# Altium footprint library Molex FFC - FPC Connectors (SMT).PcbLib: 638 footprints (part 13 of 40)
Each footprint in its own frame and in the unit in brackets; x right, y up, seen from the top. Pads: shape width x height; smd on the part's side, far side on the other; paste and mask are expansions set on the pad; w line width, h text height; cw(c..) or ccw(c..) is an arc to the next point about the centre after c.
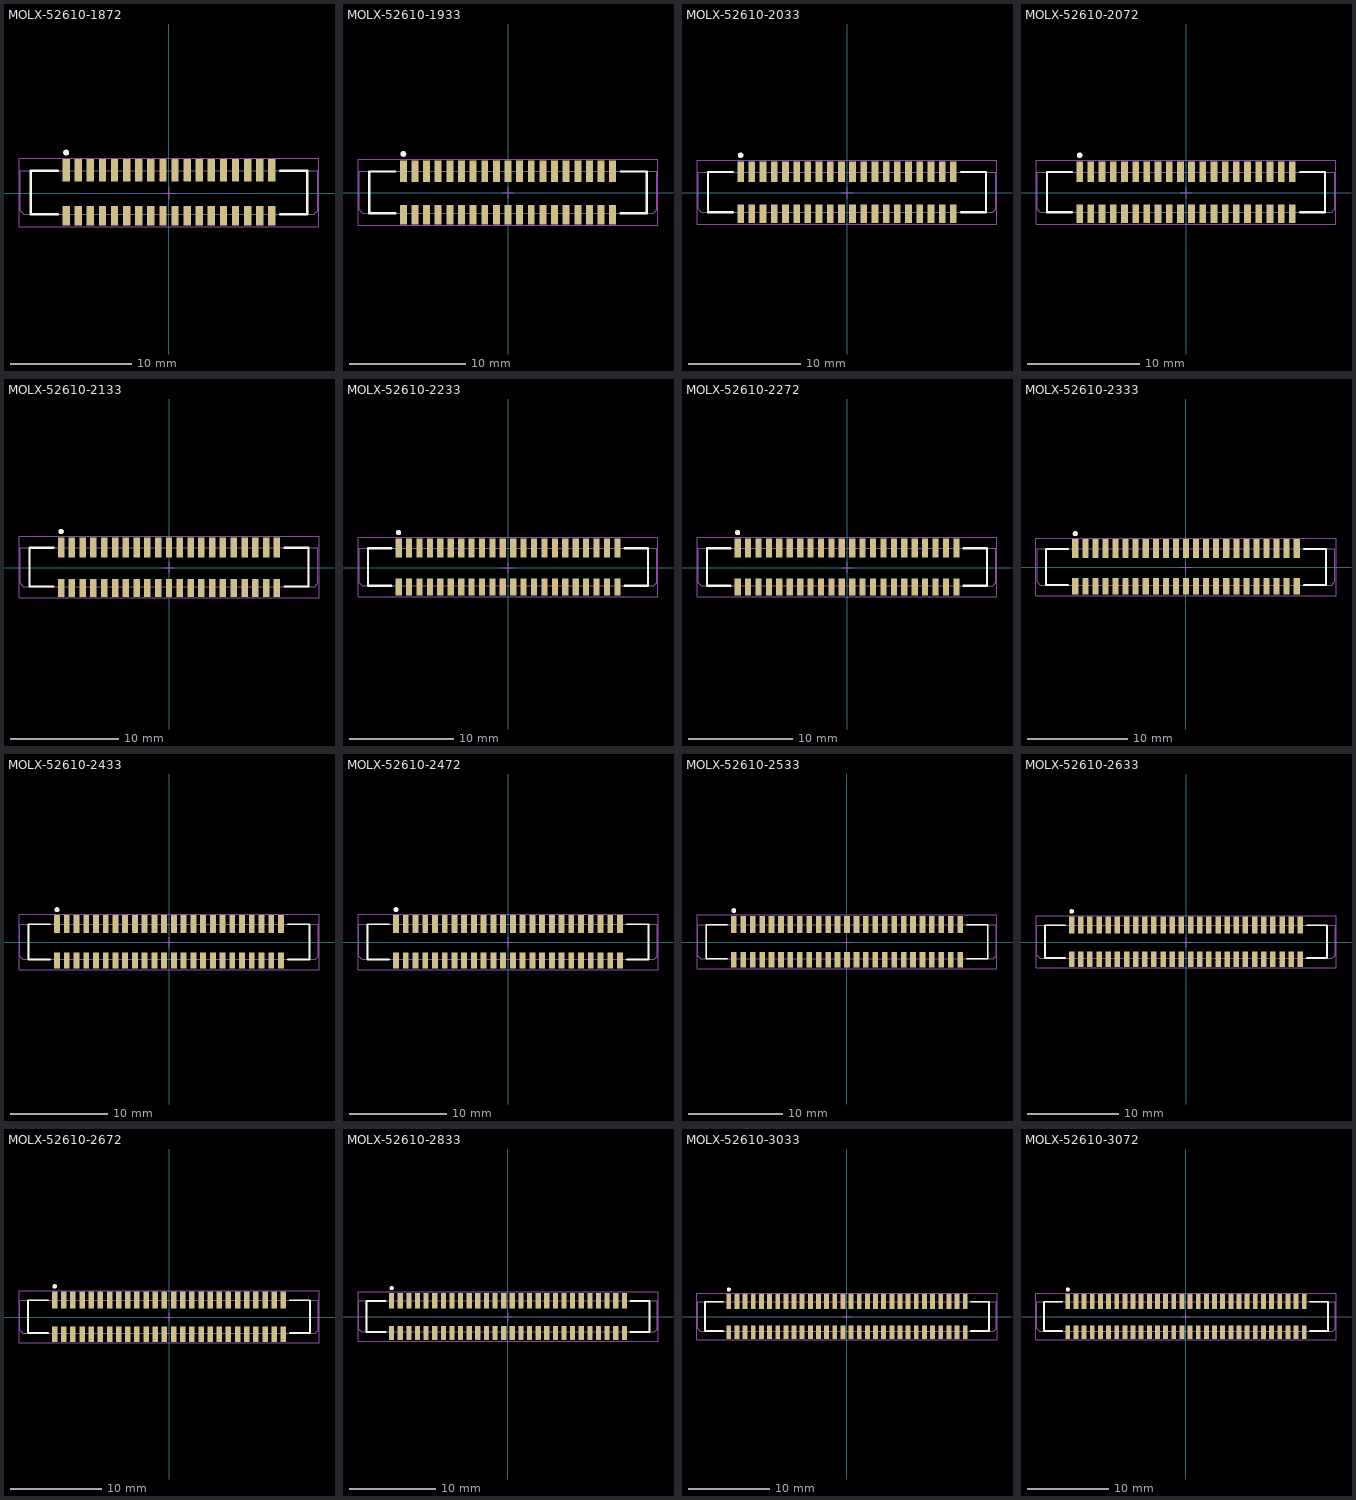
[diagram p12: the footprints below, top view; thin cyan lines are the x and y axes]

## MOLX-52610-1872 [mm] "FPC Connector, 18-Leads, Vertical, Pitch 1.0 mm, Mated Height 5.75 mm, SMT"
height 5.762
pads (36):
  rect 0.6x1.85 smd: 1A(-8.5,1.875) 2A(-7.5,1.875) 3A(-6.5,1.875) 4A(-5.5,1.875) 5A(-4.5,1.875) 6A(-3.5,1.875) 7A(-2.5,1.875) 8A(-1.5,1.875) 9A(-0.5,1.875) 10A(0.5,1.875) 11A(1.5,1.875) 12A(2.5,1.875) 13A(3.5,1.875) 14A(4.5,1.875) 15A(5.5,1.875) 16A(6.5,1.875) 17A(7.5,1.875) 18A(8.5,1.875)
  rect 0.6x1.65 smd: 1B(-8.5,-1.875) 2B(-7.5,-1.875) 3B(-6.5,-1.875) 4B(-5.5,-1.875) 5B(-4.5,-1.875) 6B(-3.5,-1.875) 7B(-2.5,-1.875) 8B(-1.5,-1.875) 9B(-0.5,-1.875) 10B(0.5,-1.875) 11B(1.5,-1.875) 12B(2.5,-1.875) 13B(3.5,-1.875) 14B(4.5,-1.875) 15B(5.5,-1.875) 16B(6.5,-1.875) 17B(7.5,-1.875) 18B(8.5,-1.875)
Top Overlay:
  circle w0.25: c-8.5,3.35 r0.125
  lines w0.2: -9.2,-1.75 -11.425,-1.75 -11.425,1.85 -9.2,1.85 ; 9.2,-1.75 11.425,-1.75 11.425,1.85 9.2,1.85
Mechanical 13:
  lines w0.1: -11.425,-1.75 -11.425,1.85 ; 11.425,-1.75 11.425,1.85 ; -12.3,-1.45 -12,-1.75 12,-1.75 12.3,-1.45 12.3,1.85 -12.3,1.85 -12.3,-1.45
Mechanical 15:
  lines w0.05: -12.4,-2.8 12.4,-2.8 12.4,2.9 -12.4,2.9 -12.4,-2.8
  lines w0.1: -0.5,0 0.5,0 ; 0,-0.5 0,0.5
3D body: height 0.25, standoff 0, extent -12.3,-2.24 12.3,2.26

## MOLX-52610-1933 [mm] "FPC Connector, 19-Leads, Vertical, Pitch 1.0 mm, Mated Height 5.75 mm, SMT"
height 5.762
pads (38):
  rect 0.6x1.85 smd: 1A(-9,1.875) 2A(-8,1.875) 3A(-7,1.875) 4A(-6,1.875) 5A(-5,1.875) 6A(-4,1.875) 7A(-3,1.875) 8A(-2,1.875) 9A(-1,1.875) 10A(0,1.875) 11A(1,1.875) 12A(2,1.875) 13A(3,1.875) 14A(4,1.875) 15A(5,1.875) 16A(6,1.875) 17A(7,1.875) 18A(8,1.875) 19A(9,1.875)
  rect 0.6x1.65 smd: 1B(-9,-1.875) 2B(-8,-1.875) 3B(-7,-1.875) 4B(-6,-1.875) 5B(-5,-1.875) 6B(-4,-1.875) 7B(-3,-1.875) 8B(-2,-1.875) 9B(-1,-1.875) 10B(0,-1.875) 11B(1,-1.875) 12B(2,-1.875) 13B(3,-1.875) 14B(4,-1.875) 15B(5,-1.875) 16B(6,-1.875) 17B(7,-1.875) 18B(8,-1.875) 19B(9,-1.875)
Top Overlay:
  circle w0.25: c-9,3.35 r0.125
  lines w0.2: -9.7,-1.75 -11.925,-1.75 -11.925,1.85 -9.7,1.85 ; 9.7,-1.75 11.925,-1.75 11.925,1.85 9.7,1.85
Mechanical 13:
  lines w0.1: -11.925,-1.75 -11.925,1.85 ; 11.925,-1.75 11.925,1.85 ; -12.8,-1.45 -12.8,1.85 12.8,1.85 12.8,-1.45 12.5,-1.75 -12.5,-1.75 -12.8,-1.45
Mechanical 15:
  lines w0.05: -12.9,-2.8 -12.9,2.9 12.9,2.9 12.9,-2.8 -12.9,-2.8
  lines w0.1: -0.5,0 0.5,0 ; 0,-0.5 0,0.5
3D body: height 0.25, standoff 0, extent -12.8,-2.24 12.8,2.26

## MOLX-52610-2033 [mm] "FPC Connector, 20-Leads, Vertical, Pitch 1.0 mm, Mated Height 5.75 mm, SMT"
height 5.762
pads (40):
  rect 0.6x1.85 smd: 1A(-9.5,1.875) 2A(-8.5,1.875) 3A(-7.5,1.875) 4A(-6.5,1.875) 5A(-5.5,1.875) 6A(-4.5,1.875) 7A(-3.5,1.875) 8A(-2.5,1.875) 9A(-1.5,1.875) 10A(-0.5,1.875) 11A(0.5,1.875) 12A(1.5,1.875) 13A(2.5,1.875) 14A(3.5,1.875) 15A(4.5,1.875) 16A(5.5,1.875) 17A(6.5,1.875) 18A(7.5,1.875) 19A(8.5,1.875) 20A(9.5,1.875)
  rect 0.6x1.65 smd: 1B(-9.5,-1.875) 2B(-8.5,-1.875) 3B(-7.5,-1.875) 4B(-6.5,-1.875) 5B(-5.5,-1.875) 6B(-4.5,-1.875) 7B(-3.5,-1.875) 8B(-2.5,-1.875) 9B(-1.5,-1.875) 10B(-0.5,-1.875) 11B(0.5,-1.875) 12B(1.5,-1.875) 13B(2.5,-1.875) 14B(3.5,-1.875) 15B(4.5,-1.875) 16B(5.5,-1.875) 17B(6.5,-1.875) 18B(7.5,-1.875) 19B(8.5,-1.875) 20B(9.5,-1.875)
Top Overlay:
  circle w0.25: c-9.5,3.35 r0.125
  lines w0.2: -10.2,-1.75 -12.425,-1.75 -12.425,1.85 -10.2,1.85 ; 10.2,1.85 12.425,1.85 12.425,-1.75 10.2,-1.75
Mechanical 13:
  lines w0.1: -12.425,-1.75 -12.425,1.85 ; 12.425,-1.75 12.425,1.85 ; -13.3,-1.45 -13,-1.75 13,-1.75 13.3,-1.45 13.3,1.85 -13.3,1.85 -13.3,-1.45
Mechanical 15:
  lines w0.05: -13.4,-2.8 13.4,-2.8 13.4,2.9 -13.4,2.9 -13.4,-2.8
  lines w0.1: -0.5,0 0.5,0 ; 0,-0.5 0,0.5
3D body: height 0.25, standoff 0, extent -13.3,-2.24 13.3,2.26

## MOLX-52610-2072 [mm] "FPC Connector, 20-Leads, Vertical, Pitch 1.0 mm, Mated Height 5.75 mm, SMT"
height 5.762
pads (40):
  rect 0.6x1.85 smd: 1A(-9.5,1.875) 2A(-8.5,1.875) 3A(-7.5,1.875) 4A(-6.5,1.875) 5A(-5.5,1.875) 6A(-4.5,1.875) 7A(-3.5,1.875) 8A(-2.5,1.875) 9A(-1.5,1.875) 10A(-0.5,1.875) 11A(0.5,1.875) 12A(1.5,1.875) 13A(2.5,1.875) 14A(3.5,1.875) 15A(4.5,1.875) 16A(5.5,1.875) 17A(6.5,1.875) 18A(7.5,1.875) 19A(8.5,1.875) 20A(9.5,1.875)
  rect 0.6x1.65 smd: 1B(-9.5,-1.875) 2B(-8.5,-1.875) 3B(-7.5,-1.875) 4B(-6.5,-1.875) 5B(-5.5,-1.875) 6B(-4.5,-1.875) 7B(-3.5,-1.875) 8B(-2.5,-1.875) 9B(-1.5,-1.875) 10B(-0.5,-1.875) 11B(0.5,-1.875) 12B(1.5,-1.875) 13B(2.5,-1.875) 14B(3.5,-1.875) 15B(4.5,-1.875) 16B(5.5,-1.875) 17B(6.5,-1.875) 18B(7.5,-1.875) 19B(8.5,-1.875) 20B(9.5,-1.875)
Top Overlay:
  circle w0.25: c-9.5,3.35 r0.125
  lines w0.2: -10.2,-1.75 -12.425,-1.75 -12.425,1.85 -10.2,1.85 ; 10.2,1.85 12.425,1.85 12.425,-1.75 10.2,-1.75
Mechanical 13:
  lines w0.1: -12.425,-1.75 -12.425,1.85 ; 12.425,-1.75 12.425,1.85 ; -13.3,-1.45 -13,-1.75 13,-1.75 13.3,-1.45 13.3,1.85 -13.3,1.85 -13.3,-1.45
Mechanical 15:
  lines w0.05: -13.4,-2.8 13.4,-2.8 13.4,2.9 -13.4,2.9 -13.4,-2.8
  lines w0.1: -0.5,0 0.5,0 ; 0,-0.5 0,0.5
3D body: height 0.25, standoff 0, extent -13.3,-2.24 13.3,2.26

## MOLX-52610-2133 [mm] "FPC Connector, 21-Leads, Vertical, Pitch 1.0 mm, Mated Height 5.75 mm, SMT"
height 5.762
pads (42):
  rect 0.6x1.85 smd: 1A(-10,1.875) 2A(-9,1.875) 3A(-8,1.875) 4A(-7,1.875) 5A(-6,1.875) 6A(-5,1.875) 7A(-4,1.875) 8A(-3,1.875) 9A(-2,1.875) 10A(-1,1.875) 11A(0,1.875) 12A(1,1.875) 13A(2,1.875) 14A(3,1.875) 15A(4,1.875) 16A(5,1.875) 17A(6,1.875) 18A(7,1.875) 19A(8,1.875) 20A(9,1.875) 21A(10,1.875)
  rect 0.6x1.65 smd: 1B(-10,-1.875) 2B(-9,-1.875) 3B(-8,-1.875) 4B(-7,-1.875) 5B(-6,-1.875) 6B(-5,-1.875) 7B(-4,-1.875) 8B(-3,-1.875) 9B(-2,-1.875) 10B(-1,-1.875) 11B(0,-1.875) 12B(1,-1.875) 13B(2,-1.875) 14B(3,-1.875) 15B(4,-1.875) 16B(5,-1.875) 17B(6,-1.875) 18B(7,-1.875) 19B(8,-1.875) 20B(9,-1.875) 21B(10,-1.875)
Top Overlay:
  circle w0.25: c-10,3.35 r0.125
  lines w0.2: -10.7,-1.75 -12.925,-1.75 -12.925,1.85 -10.7,1.85 ; 10.7,-1.75 12.925,-1.75 12.925,1.85 10.7,1.85
Mechanical 13:
  lines w0.1: -12.925,-1.75 -12.925,1.85 ; 12.925,-1.75 12.925,1.85 ; -13.8,-1.45 -13.5,-1.75 13.5,-1.75 13.8,-1.45 13.8,1.85 -13.8,1.85 -13.8,-1.45
Mechanical 15:
  lines w0.05: -13.9,-2.8 13.9,-2.8 13.9,2.9 -13.9,2.9 -13.9,-2.8
  lines w0.1: -0.5,0 0.5,0 ; 0,-0.5 0,0.5
3D body: height 0.25, standoff 0, extent -13.8,-2.24 13.8,2.26

## MOLX-52610-2233 [mm] "FPC Connector, 22-Leads, Vertical, Pitch 1.0 mm, Mated Height 5.75 mm, SMT"
height 5.762
pads (44):
  rect 0.6x1.85 smd: 1A(-10.5,1.875) 2A(-9.5,1.875) 3A(-8.5,1.875) 4A(-7.5,1.875) 5A(-6.5,1.875) 6A(-5.5,1.875) 7A(-4.5,1.875) 8A(-3.5,1.875) 9A(-2.5,1.875) 10A(-1.5,1.875) 11A(-0.5,1.875) 12A(0.5,1.875) 13A(1.5,1.875) 14A(2.5,1.875) 15A(3.5,1.875) 16A(4.5,1.875) 17A(5.5,1.875) 18A(6.5,1.875) 19A(7.5,1.875) 20A(8.5,1.875) 21A(9.5,1.875) 22A(10.5,1.875)
  rect 0.6x1.65 smd: 1B(-10.5,-1.875) 2B(-9.5,-1.875) 3B(-8.5,-1.875) 4B(-7.5,-1.875) 5B(-6.5,-1.875) 6B(-5.5,-1.875) 7B(-4.5,-1.875) 8B(-3.5,-1.875) 9B(-2.5,-1.875) 10B(-1.5,-1.875) 11B(-0.5,-1.875) 12B(0.5,-1.875) 13B(1.5,-1.875) 14B(2.5,-1.875) 15B(3.5,-1.875) 16B(4.5,-1.875) 17B(5.5,-1.875) 18B(6.5,-1.875) 19B(7.5,-1.875) 20B(8.5,-1.875) 21B(9.5,-1.875) 22B(10.5,-1.875)
Top Overlay:
  circle w0.25: c-10.5,3.35 r0.125
  lines w0.2: -11.2,-1.75 -13.425,-1.75 -13.425,1.85 -11.2,1.85 ; 11.2,-1.75 13.425,-1.75 13.425,1.85 11.2,1.85
Mechanical 13:
  lines w0.1: -13.425,-1.75 -13.425,1.85 ; 13.425,-1.75 13.425,1.85 ; -14.3,-1.45 -14.3,1.85 14.3,1.85 14.3,-1.45 14,-1.75 -14,-1.75 -14.3,-1.45
Mechanical 15:
  lines w0.05: -14.4,-2.8 -14.4,2.9 14.4,2.9 14.4,-2.8 -14.4,-2.8
  lines w0.1: -0.5,0 0.5,0 ; 0,-0.5 0,0.5
3D body: height 0.25, standoff 0, extent -14.3,-2.24 14.3,2.26

## MOLX-52610-2272 [mm] "FPC Connector, 22-Leads, Vertical, Pitch 1.0 mm, Mated Height 5.75 mm, SMT"
height 5.762
pads (44):
  rect 0.6x1.85 smd: 1A(-10.5,1.875) 2A(-9.5,1.875) 3A(-8.5,1.875) 4A(-7.5,1.875) 5A(-6.5,1.875) 6A(-5.5,1.875) 7A(-4.5,1.875) 8A(-3.5,1.875) 9A(-2.5,1.875) 10A(-1.5,1.875) 11A(-0.5,1.875) 12A(0.5,1.875) 13A(1.5,1.875) 14A(2.5,1.875) 15A(3.5,1.875) 16A(4.5,1.875) 17A(5.5,1.875) 18A(6.5,1.875) 19A(7.5,1.875) 20A(8.5,1.875) 21A(9.5,1.875) 22A(10.5,1.875)
  rect 0.6x1.65 smd: 1B(-10.5,-1.875) 2B(-9.5,-1.875) 3B(-8.5,-1.875) 4B(-7.5,-1.875) 5B(-6.5,-1.875) 6B(-5.5,-1.875) 7B(-4.5,-1.875) 8B(-3.5,-1.875) 9B(-2.5,-1.875) 10B(-1.5,-1.875) 11B(-0.5,-1.875) 12B(0.5,-1.875) 13B(1.5,-1.875) 14B(2.5,-1.875) 15B(3.5,-1.875) 16B(4.5,-1.875) 17B(5.5,-1.875) 18B(6.5,-1.875) 19B(7.5,-1.875) 20B(8.5,-1.875) 21B(9.5,-1.875) 22B(10.5,-1.875)
Top Overlay:
  circle w0.25: c-10.5,3.35 r0.125
  lines w0.2: -11.2,-1.75 -13.425,-1.75 -13.425,1.85 -11.2,1.85 ; 11.2,-1.75 13.425,-1.75 13.425,1.85 11.2,1.85
Mechanical 13:
  lines w0.1: -13.425,-1.75 -13.425,1.85 ; 13.425,-1.75 13.425,1.85 ; -14.3,-1.45 -14.3,1.85 14.3,1.85 14.3,-1.45 14,-1.75 -14,-1.75 -14.3,-1.45
Mechanical 15:
  lines w0.05: -14.4,-2.8 -14.4,2.9 14.4,2.9 14.4,-2.8 -14.4,-2.8
  lines w0.1: -0.5,0 0.5,0 ; 0,-0.5 0,0.5
3D body: height 0.25, standoff 0, extent -14.3,-2.24 14.3,2.26

## MOLX-52610-2333 [mm] "FPC Connector, 23-Leads, Vertical, Pitch 1.0 mm, Mated Height 5.75 mm, SMT"
height 5.762
pads (46):
  rect 0.6x1.85 smd: 1A(-11,1.875) 2A(-10,1.875) 3A(-9,1.875) 4A(-8,1.875) 5A(-7,1.875) 6A(-6,1.875) 7A(-5,1.875) 8A(-4,1.875) 9A(-3,1.875) 10A(-2,1.875) 11A(-1,1.875) 12A(0,1.875) 13A(1,1.875) 14A(2,1.875) 15A(3,1.875) 16A(4,1.875) 17A(5,1.875) 18A(6,1.875) 19A(7,1.875) 20A(8,1.875) 21A(9,1.875) 22A(10,1.875) 23A(11,1.875)
  rect 0.6x1.65 smd: 1B(-11,-1.875) 2B(-10,-1.875) 3B(-9,-1.875) 4B(-8,-1.875) 5B(-7,-1.875) 6B(-6,-1.875) 7B(-5,-1.875) 8B(-4,-1.875) 9B(-3,-1.875) 10B(-2,-1.875) 11B(-1,-1.875) 12B(0,-1.875) 13B(1,-1.875) 14B(2,-1.875) 15B(3,-1.875) 16B(4,-1.875) 17B(5,-1.875) 18B(6,-1.875) 19B(7,-1.875) 20B(8,-1.875) 21B(9,-1.875) 22B(10,-1.875) 23B(11,-1.875)
Top Overlay:
  circle w0.25: c-11,3.35 r0.125
  lines w0.2: -11.7,-1.75 -13.925,-1.75 -13.925,1.85 -11.7,1.85 ; 11.7,-1.75 13.925,-1.75 13.925,1.85 11.7,1.85
Mechanical 13:
  lines w0.1: -13.925,-1.75 -13.925,1.85 ; 13.925,-1.75 13.925,1.85 ; -14.8,-1.45 -14.5,-1.75 14.5,-1.75 14.8,-1.45 14.8,1.85 -14.8,1.85 -14.8,-1.45
Mechanical 15:
  lines w0.05: -14.9,-2.8 14.9,-2.8 14.9,2.9 -14.9,2.9 -14.9,-2.8
  lines w0.1: -0.5,0 0.5,0 ; 0,-0.5 0,0.5
3D body: height 0.25, standoff 0, extent -14.8,-2.24 14.8,2.26

## MOLX-52610-2433 [mm] "FPC Connector, 24-Leads, Vertical, Pitch 1.0 mm, Mated Height 5.75 mm, SMT"
height 5.762
pads (48):
  rect 0.6x1.85 smd: 1A(-11.5,1.875) 2A(-10.5,1.875) 3A(-9.5,1.875) 4A(-8.5,1.875) 5A(-7.5,1.875) 6A(-6.5,1.875) 7A(-5.5,1.875) 8A(-4.5,1.875) 9A(-3.5,1.875) 10A(-2.5,1.875) 11A(-1.5,1.875) 12A(-0.5,1.875) 13A(0.5,1.875) 14A(1.5,1.875) 15A(2.5,1.875) 16A(3.5,1.875) 17A(4.5,1.875) 18A(5.5,1.875) 19A(6.5,1.875) 20A(7.5,1.875) 21A(8.5,1.875) 22A(9.5,1.875) 23A(10.5,1.875) 24A(11.5,1.875)
  rect 0.6x1.65 smd: 1B(-11.5,-1.875) 2B(-10.5,-1.875) 3B(-9.5,-1.875) 4B(-8.5,-1.875) 5B(-7.5,-1.875) 6B(-6.5,-1.875) 7B(-5.5,-1.875) 8B(-4.5,-1.875) 9B(-3.5,-1.875) 10B(-2.5,-1.875) 11B(-1.5,-1.875) 12B(-0.5,-1.875) 13B(0.5,-1.875) 14B(1.5,-1.875) 15B(2.5,-1.875) 16B(3.5,-1.875) 17B(4.5,-1.875) 18B(5.5,-1.875) 19B(6.5,-1.875) 20B(7.5,-1.875) 21B(8.5,-1.875) 22B(9.5,-1.875) 23B(10.5,-1.875) 24B(11.5,-1.875)
Top Overlay:
  circle w0.25: c-11.5,3.35 r0.125
  lines w0.2: -12.2,-1.75 -14.425,-1.75 -14.425,1.85 -12.2,1.85 ; 12.2,-1.75 14.425,-1.75 14.425,1.85 12.2,1.85
Mechanical 13:
  lines w0.1: -14.425,-1.75 -14.425,1.85 ; 14.425,-1.75 14.425,1.85 ; -15.3,-1.45 -15,-1.75 15,-1.75 15.3,-1.45 15.3,1.85 -15.3,1.85 -15.3,-1.45
Mechanical 15:
  lines w0.05: -15.4,-2.8 15.4,-2.8 15.4,2.9 -15.4,2.9 -15.4,-2.8
  lines w0.1: -0.5,0 0.5,0 ; 0,-0.5 0,0.5
3D body: height 0.25, standoff 0, extent -15.3,-2.24 15.3,2.26

## MOLX-52610-2472 [mm] "FPC Connector, 24-Leads, Vertical, Pitch 1.0 mm, Mated Height 5.75 mm, SMT"
height 5.762
pads (48):
  rect 0.6x1.85 smd: 1A(-11.5,1.875) 2A(-10.5,1.875) 3A(-9.5,1.875) 4A(-8.5,1.875) 5A(-7.5,1.875) 6A(-6.5,1.875) 7A(-5.5,1.875) 8A(-4.5,1.875) 9A(-3.5,1.875) 10A(-2.5,1.875) 11A(-1.5,1.875) 12A(-0.5,1.875) 13A(0.5,1.875) 14A(1.5,1.875) 15A(2.5,1.875) 16A(3.5,1.875) 17A(4.5,1.875) 18A(5.5,1.875) 19A(6.5,1.875) 20A(7.5,1.875) 21A(8.5,1.875) 22A(9.5,1.875) 23A(10.5,1.875) 24A(11.5,1.875)
  rect 0.6x1.65 smd: 1B(-11.5,-1.875) 2B(-10.5,-1.875) 3B(-9.5,-1.875) 4B(-8.5,-1.875) 5B(-7.5,-1.875) 6B(-6.5,-1.875) 7B(-5.5,-1.875) 8B(-4.5,-1.875) 9B(-3.5,-1.875) 10B(-2.5,-1.875) 11B(-1.5,-1.875) 12B(-0.5,-1.875) 13B(0.5,-1.875) 14B(1.5,-1.875) 15B(2.5,-1.875) 16B(3.5,-1.875) 17B(4.5,-1.875) 18B(5.5,-1.875) 19B(6.5,-1.875) 20B(7.5,-1.875) 21B(8.5,-1.875) 22B(9.5,-1.875) 23B(10.5,-1.875) 24B(11.5,-1.875)
Top Overlay:
  circle w0.25: c-11.5,3.35 r0.125
  lines w0.2: -12.2,-1.75 -14.425,-1.75 -14.425,1.85 -12.2,1.85 ; 12.2,-1.75 14.425,-1.75 14.425,1.85 12.2,1.85
Mechanical 13:
  lines w0.1: -14.425,-1.75 -14.425,1.85 ; 14.425,-1.75 14.425,1.85 ; -15.3,-1.45 -15.3,1.85 15.3,1.85 15.3,-1.45 15,-1.75 -15,-1.75 -15.3,-1.45
Mechanical 15:
  lines w0.05: -15.4,-2.8 -15.4,2.9 15.4,2.9 15.4,-2.8 -15.4,-2.8
  lines w0.1: -0.5,0 0.5,0 ; 0,-0.5 0,0.5
3D body: height 0.25, standoff 0, extent -15.3,-2.24 15.3,2.26

## MOLX-52610-2533 [mm] "FPC Connector, 25-Leads, Vertical, Pitch 1.0 mm, Mated Height 5.75 mm, SMT"
height 5.762
pads (50):
  rect 0.6x1.85 smd: 1A(-12,1.875) 2A(-11,1.875) 3A(-10,1.875) 4A(-9,1.875) 5A(-8,1.875) 6A(-7,1.875) 7A(-6,1.875) 8A(-5,1.875) 9A(-4,1.875) 10A(-3,1.875) 11A(-2,1.875) 12A(-1,1.875) 13A(0,1.875) 14A(1,1.875) 15A(2,1.875) 16A(3,1.875) 17A(4,1.875) 18A(5,1.875) 19A(6,1.875) 20A(7,1.875) 21A(8,1.875) 22A(9,1.875) 23A(10,1.875) 24A(11,1.875) 25A(12,1.875)
  rect 0.6x1.65 smd: 1B(-12,-1.875) 2B(-11,-1.875) 3B(-10,-1.875) 4B(-9,-1.875) 5B(-8,-1.875) 6B(-7,-1.875) 7B(-6,-1.875) 8B(-5,-1.875) 9B(-4,-1.875) 10B(-3,-1.875) 11B(-2,-1.875) 12B(-1,-1.875) 13B(0,-1.875) 14B(1,-1.875) 15B(2,-1.875) 16B(3,-1.875) 17B(4,-1.875) 18B(5,-1.875) 19B(6,-1.875) 20B(7,-1.875) 21B(8,-1.875) 22B(9,-1.875) 23B(10,-1.875) 24B(11,-1.875) 25B(12,-1.875)
Top Overlay:
  circle w0.25: c-12,3.35 r0.125
  lines w0.2: -12.7,-1.75 -14.925,-1.75 -14.925,1.85 -12.7,1.85 ; 12.7,-1.75 14.925,-1.75 14.925,1.85 12.7,1.85
Mechanical 13:
  lines w0.1: -14.925,-1.75 -14.925,1.85 ; 14.925,-1.75 14.925,1.85 ; -15.8,-1.45 -15.8,1.85 15.8,1.85 15.8,-1.45 15.5,-1.75 -15.5,-1.75 -15.8,-1.45
Mechanical 15:
  lines w0.05: -15.9,-2.8 -15.9,2.9 15.9,2.9 15.9,-2.8 -15.9,-2.8
  lines w0.1: -0.5,0 0.5,0 ; 0,-0.5 0,0.5
3D body: height 0.25, standoff 0, extent -15.8,-2.24 15.8,2.26

## MOLX-52610-2633 [mm] "FPC Connector, 26-Leads, Vertical, Pitch 1.0 mm, Mated Height 5.75 mm, SMT"
height 5.762
pads (52):
  rect 0.6x1.85 smd: 1A(-12.5,1.875) 2A(-11.5,1.875) 3A(-10.5,1.875) 4A(-9.5,1.875) 5A(-8.5,1.875) 6A(-7.5,1.875) 7A(-6.5,1.875) 8A(-5.5,1.875) 9A(-4.5,1.875) 10A(-3.5,1.875) 11A(-2.5,1.875) 12A(-1.5,1.875) 13A(-0.5,1.875) 14A(0.5,1.875) 15A(1.5,1.875) 16A(2.5,1.875) 17A(3.5,1.875) 18A(4.5,1.875) 19A(5.5,1.875) 20A(6.5,1.875) 21A(7.5,1.875) 22A(8.5,1.875) 23A(9.5,1.875) 24A(10.5,1.875) 25A(11.5,1.875) 26A(12.5,1.875)
  rect 0.6x1.65 smd: 1B(-12.5,-1.875) 2B(-11.5,-1.875) 3B(-10.5,-1.875) 4B(-9.5,-1.875) 5B(-8.5,-1.875) 6B(-7.5,-1.875) 7B(-6.5,-1.875) 8B(-5.5,-1.875) 9B(-4.5,-1.875) 10B(-3.5,-1.875) 11B(-2.5,-1.875) 12B(-1.5,-1.875) 13B(-0.5,-1.875) 14B(0.5,-1.875) 15B(1.5,-1.875) 16B(2.5,-1.875) 17B(3.5,-1.875) 18B(4.5,-1.875) 19B(5.5,-1.875) 20B(6.5,-1.875) 21B(7.5,-1.875) 22B(8.5,-1.875) 23B(9.5,-1.875) 24B(10.5,-1.875) 25B(11.5,-1.875) 26B(12.5,-1.875)
Top Overlay:
  circle w0.25: c-12.5,3.35 r0.125
  lines w0.2: -13.2,-1.75 -15.425,-1.75 -15.425,1.85 -13.2,1.85 ; 13.2,-1.75 15.425,-1.75 15.425,1.85 13.2,1.85
Mechanical 13:
  lines w0.1: -15.425,-1.75 -15.425,1.85 ; 15.425,-1.75 15.425,1.85 ; -16.3,-1.45 -16,-1.75 16,-1.75 16.3,-1.45 16.3,1.85 -16.3,1.85 -16.3,-1.45
Mechanical 15:
  lines w0.05: -16.4,-2.8 16.4,-2.8 16.4,2.9 -16.4,2.9 -16.4,-2.8
  lines w0.1: -0.5,0 0.5,0 ; 0,-0.5 0,0.5
3D body: height 0.25, standoff 0, extent -16.3,-2.24 16.3,2.26

## MOLX-52610-2672 [mm] "FPC Connector, 26-Leads, Vertical, Pitch 1.0 mm, Mated Height 5.75 mm, SMT"
height 5.762
pads (52):
  rect 0.6x1.85 smd: 1A(-12.5,1.875) 2A(-11.5,1.875) 3A(-10.5,1.875) 4A(-9.5,1.875) 5A(-8.5,1.875) 6A(-7.5,1.875) 7A(-6.5,1.875) 8A(-5.5,1.875) 9A(-4.5,1.875) 10A(-3.5,1.875) 11A(-2.5,1.875) 12A(-1.5,1.875) 13A(-0.5,1.875) 14A(0.5,1.875) 15A(1.5,1.875) 16A(2.5,1.875) 17A(3.5,1.875) 18A(4.5,1.875) 19A(5.5,1.875) 20A(6.5,1.875) 21A(7.5,1.875) 22A(8.5,1.875) 23A(9.5,1.875) 24A(10.5,1.875) 25A(11.5,1.875) 26A(12.5,1.875)
  rect 0.6x1.65 smd: 1B(-12.5,-1.875) 2B(-11.5,-1.875) 3B(-10.5,-1.875) 4B(-9.5,-1.875) 5B(-8.5,-1.875) 6B(-7.5,-1.875) 7B(-6.5,-1.875) 8B(-5.5,-1.875) 9B(-4.5,-1.875) 10B(-3.5,-1.875) 11B(-2.5,-1.875) 12B(-1.5,-1.875) 13B(-0.5,-1.875) 14B(0.5,-1.875) 15B(1.5,-1.875) 16B(2.5,-1.875) 17B(3.5,-1.875) 18B(4.5,-1.875) 19B(5.5,-1.875) 20B(6.5,-1.875) 21B(7.5,-1.875) 22B(8.5,-1.875) 23B(9.5,-1.875) 24B(10.5,-1.875) 25B(11.5,-1.875) 26B(12.5,-1.875)
Top Overlay:
  circle w0.25: c-12.5,3.35 r0.125
  lines w0.2: -13.2,-1.75 -15.425,-1.75 -15.425,1.85 -13.2,1.85 ; 13.2,-1.75 15.425,-1.75 15.425,1.85 13.2,1.85
Mechanical 13:
  lines w0.1: -15.425,-1.75 -15.425,1.85 ; 15.425,-1.75 15.425,1.85 ; -16.3,-1.45 -16.3,1.85 16.3,1.85 16.3,-1.45 16,-1.75 -16,-1.75 -16.3,-1.45
Mechanical 15:
  lines w0.05: -16.4,-2.8 -16.4,2.9 16.4,2.9 16.4,-2.8 -16.4,-2.8
  lines w0.1: -0.5,0 0.5,0 ; 0,-0.5 0,0.5
3D body: height 0.25, standoff 0, extent -16.3,-2.24 16.3,2.26

## MOLX-52610-2833 [mm] "FPC Connector, 28-Leads, Vertical, Pitch 1.0 mm, Mated Height 5.75 mm, SMT"
height 5.762
pads (56):
  rect 0.6x1.85 smd: 1A(-13.5,1.875) 2A(-12.5,1.875) 3A(-11.5,1.875) 4A(-10.5,1.875) 5A(-9.5,1.875) 6A(-8.5,1.875) 7A(-7.5,1.875) 8A(-6.5,1.875) 9A(-5.5,1.875) 10A(-4.5,1.875) 11A(-3.5,1.875) 12A(-2.5,1.875) 13A(-1.5,1.875) 14A(-0.5,1.875) 15A(0.5,1.875) 16A(1.5,1.875) 17A(2.5,1.875) 18A(3.5,1.875) 19A(4.5,1.875) 20A(5.5,1.875) 21A(6.5,1.875) 22A(7.5,1.875) 23A(8.5,1.875) 24A(9.5,1.875) 25A(10.5,1.875) 26A(11.5,1.875) 27A(12.5,1.875) 28A(13.5,1.875)
  rect 0.6x1.65 smd: 1B(-13.5,-1.875) 2B(-12.5,-1.875) 3B(-11.5,-1.875) 4B(-10.5,-1.875) 5B(-9.5,-1.875) 6B(-8.5,-1.875) 7B(-7.5,-1.875) 8B(-6.5,-1.875) 9B(-5.5,-1.875) 10B(-4.5,-1.875) 11B(-3.5,-1.875) 12B(-2.5,-1.875) 13B(-1.5,-1.875) 14B(-0.5,-1.875) 15B(0.5,-1.875) 16B(1.5,-1.875) 17B(2.5,-1.875) 18B(3.5,-1.875) 19B(4.5,-1.875) 20B(5.5,-1.875) 21B(6.5,-1.875) 22B(7.5,-1.875) 23B(8.5,-1.875) 24B(9.5,-1.875) 25B(10.5,-1.875) 26B(11.5,-1.875) 27B(12.5,-1.875) 28B(13.5,-1.875)
Top Overlay:
  circle w0.25: c-13.5,3.35 r0.125
  lines w0.2: -14.2,-1.75 -16.425,-1.75 -16.425,1.85 -14.2,1.85 ; 14.2,-1.75 16.425,-1.75 16.425,1.85 14.2,1.85
Mechanical 13:
  lines w0.1: -16.425,-1.75 -16.425,1.85 ; 16.425,-1.75 16.425,1.85 ; -17.3,-1.45 -17.3,1.85 17.3,1.85 17.3,-1.45 17,-1.75 -17,-1.75 -17.3,-1.45
Mechanical 15:
  lines w0.05: -17.4,-2.8 -17.4,2.9 17.4,2.9 17.4,-2.8 -17.4,-2.8
  lines w0.1: -0.5,0 0.5,0 ; 0,-0.5 0,0.5
3D body: height 0.25, standoff 0, extent -17.3,-2.24 17.3,2.26

## MOLX-52610-3033 [mm] "FPC Connector, 30-Leads, Vertical, Pitch 1.0 mm, Mated Height 5.75 mm, SMT"
height 5.762
pads (60):
  rect 0.6x1.85 smd: 1A(-14.5,1.875) 2A(-13.5,1.875) 3A(-12.5,1.875) 4A(-11.5,1.875) 5A(-10.5,1.875) 6A(-9.5,1.875) 7A(-8.5,1.875) 8A(-7.5,1.875) 9A(-6.5,1.875) 10A(-5.5,1.875) 11A(-4.5,1.875) 12A(-3.5,1.875) 13A(-2.5,1.875) 14A(-1.5,1.875) 15A(-0.5,1.875) 16A(0.5,1.875) 17A(1.5,1.875) 18A(2.5,1.875) 19A(3.5,1.875) 20A(4.5,1.875) 21A(5.5,1.875) 22A(6.5,1.875) 23A(7.5,1.875) 24A(8.5,1.875) 25A(9.5,1.875) 26A(10.5,1.875) 27A(11.5,1.875) 28A(12.5,1.875) 29A(13.5,1.875) 30A(14.5,1.875)
  rect 0.6x1.65 smd: 1B(-14.5,-1.875) 2B(-13.5,-1.875) 3B(-12.5,-1.875) 4B(-11.5,-1.875) 5B(-10.5,-1.875) 6B(-9.5,-1.875) 7B(-8.5,-1.875) 8B(-7.5,-1.875) 9B(-6.5,-1.875) 10B(-5.5,-1.875) 11B(-4.5,-1.875) 12B(-3.5,-1.875) 13B(-2.5,-1.875) 14B(-1.5,-1.875) 15B(-0.5,-1.875) 16B(0.5,-1.875) 17B(1.5,-1.875) 18B(2.5,-1.875) 19B(3.5,-1.875) 20B(4.5,-1.875) 21B(5.5,-1.875) 22B(6.5,-1.875) 23B(7.5,-1.875) 24B(8.5,-1.875) 25B(9.5,-1.875) 26B(10.5,-1.875) 27B(11.5,-1.875) 28B(12.5,-1.875) 29B(13.5,-1.875) 30B(14.5,-1.875)
Top Overlay:
  circle w0.25: c-14.5,3.35 r0.125
  lines w0.2: -15.2,-1.75 -17.425,-1.75 -17.425,1.85 -15.2,1.85 ; 15.2,-1.75 17.425,-1.75 17.425,1.85 15.2,1.85
Mechanical 13:
  lines w0.1: -17.425,-1.75 -17.425,1.85 ; 17.425,-1.75 17.425,1.85 ; -18.3,-1.45 -18.3,1.85 18.3,1.85 18.3,-1.45 18,-1.75 -18,-1.75 -18.3,-1.45
Mechanical 15:
  lines w0.05: -18.4,-2.8 -18.4,2.9 18.4,2.9 18.4,-2.8 -18.4,-2.8
  lines w0.1: -0.5,0 0.5,0 ; 0,-0.5 0,0.5
3D body: height 0.25, standoff 0, extent -18.3,-2.24 18.3,2.26

## MOLX-52610-3072 [mm] "FPC Connector, 30-Leads, Vertical, Pitch 1.0 mm, Mated Height 5.75 mm, SMT"
height 5.762
pads (60):
  rect 0.6x1.85 smd: 1A(-14.5,1.875) 2A(-13.5,1.875) 3A(-12.5,1.875) 4A(-11.5,1.875) 5A(-10.5,1.875) 6A(-9.5,1.875) 7A(-8.5,1.875) 8A(-7.5,1.875) 9A(-6.5,1.875) 10A(-5.5,1.875) 11A(-4.5,1.875) 12A(-3.5,1.875) 13A(-2.5,1.875) 14A(-1.5,1.875) 15A(-0.5,1.875) 16A(0.5,1.875) 17A(1.5,1.875) 18A(2.5,1.875) 19A(3.5,1.875) 20A(4.5,1.875) 21A(5.5,1.875) 22A(6.5,1.875) 23A(7.5,1.875) 24A(8.5,1.875) 25A(9.5,1.875) 26A(10.5,1.875) 27A(11.5,1.875) 28A(12.5,1.875) 29A(13.5,1.875) 30A(14.5,1.875)
  rect 0.6x1.65 smd: 1B(-14.5,-1.875) 2B(-13.5,-1.875) 3B(-12.5,-1.875) 4B(-11.5,-1.875) 5B(-10.5,-1.875) 6B(-9.5,-1.875) 7B(-8.5,-1.875) 8B(-7.5,-1.875) 9B(-6.5,-1.875) 10B(-5.5,-1.875) 11B(-4.5,-1.875) 12B(-3.5,-1.875) 13B(-2.5,-1.875) 14B(-1.5,-1.875) 15B(-0.5,-1.875) 16B(0.5,-1.875) 17B(1.5,-1.875) 18B(2.5,-1.875) 19B(3.5,-1.875) 20B(4.5,-1.875) 21B(5.5,-1.875) 22B(6.5,-1.875) 23B(7.5,-1.875) 24B(8.5,-1.875) 25B(9.5,-1.875) 26B(10.5,-1.875) 27B(11.5,-1.875) 28B(12.5,-1.875) 29B(13.5,-1.875) 30B(14.5,-1.875)
Top Overlay:
  circle w0.25: c-14.5,3.35 r0.125
  lines w0.2: -15.2,-1.75 -17.425,-1.75 -17.425,1.85 -15.2,1.85 ; 15.2,-1.75 17.425,-1.75 17.425,1.85 15.2,1.85
Mechanical 13:
  lines w0.1: -17.425,-1.75 -17.425,1.85 ; 17.425,-1.75 17.425,1.85 ; -18.3,-1.45 -18,-1.75 18,-1.75 18.3,-1.45 18.3,1.85 -18.3,1.85 -18.3,-1.45
Mechanical 15:
  lines w0.05: -18.4,-2.8 18.4,-2.8 18.4,2.9 -18.4,2.9 -18.4,-2.8
  lines w0.1: -0.5,0 0.5,0 ; 0,-0.5 0,0.5
3D body: height 0.25, standoff 0, extent -18.3,-2.24 18.3,2.26